# Altium footprint library 0422.PcbLib: 47 footprints (part 1 of 3)
Each footprint in its own frame and in the unit in brackets; x right, y up, seen from the top. Pads: shape width x height; smd on the part's side, far side on the other; paste and mask are expansions set on the pad; w line width, h text height; cw(c..) or ccw(c..) is an arc to the next point about the centre after c.
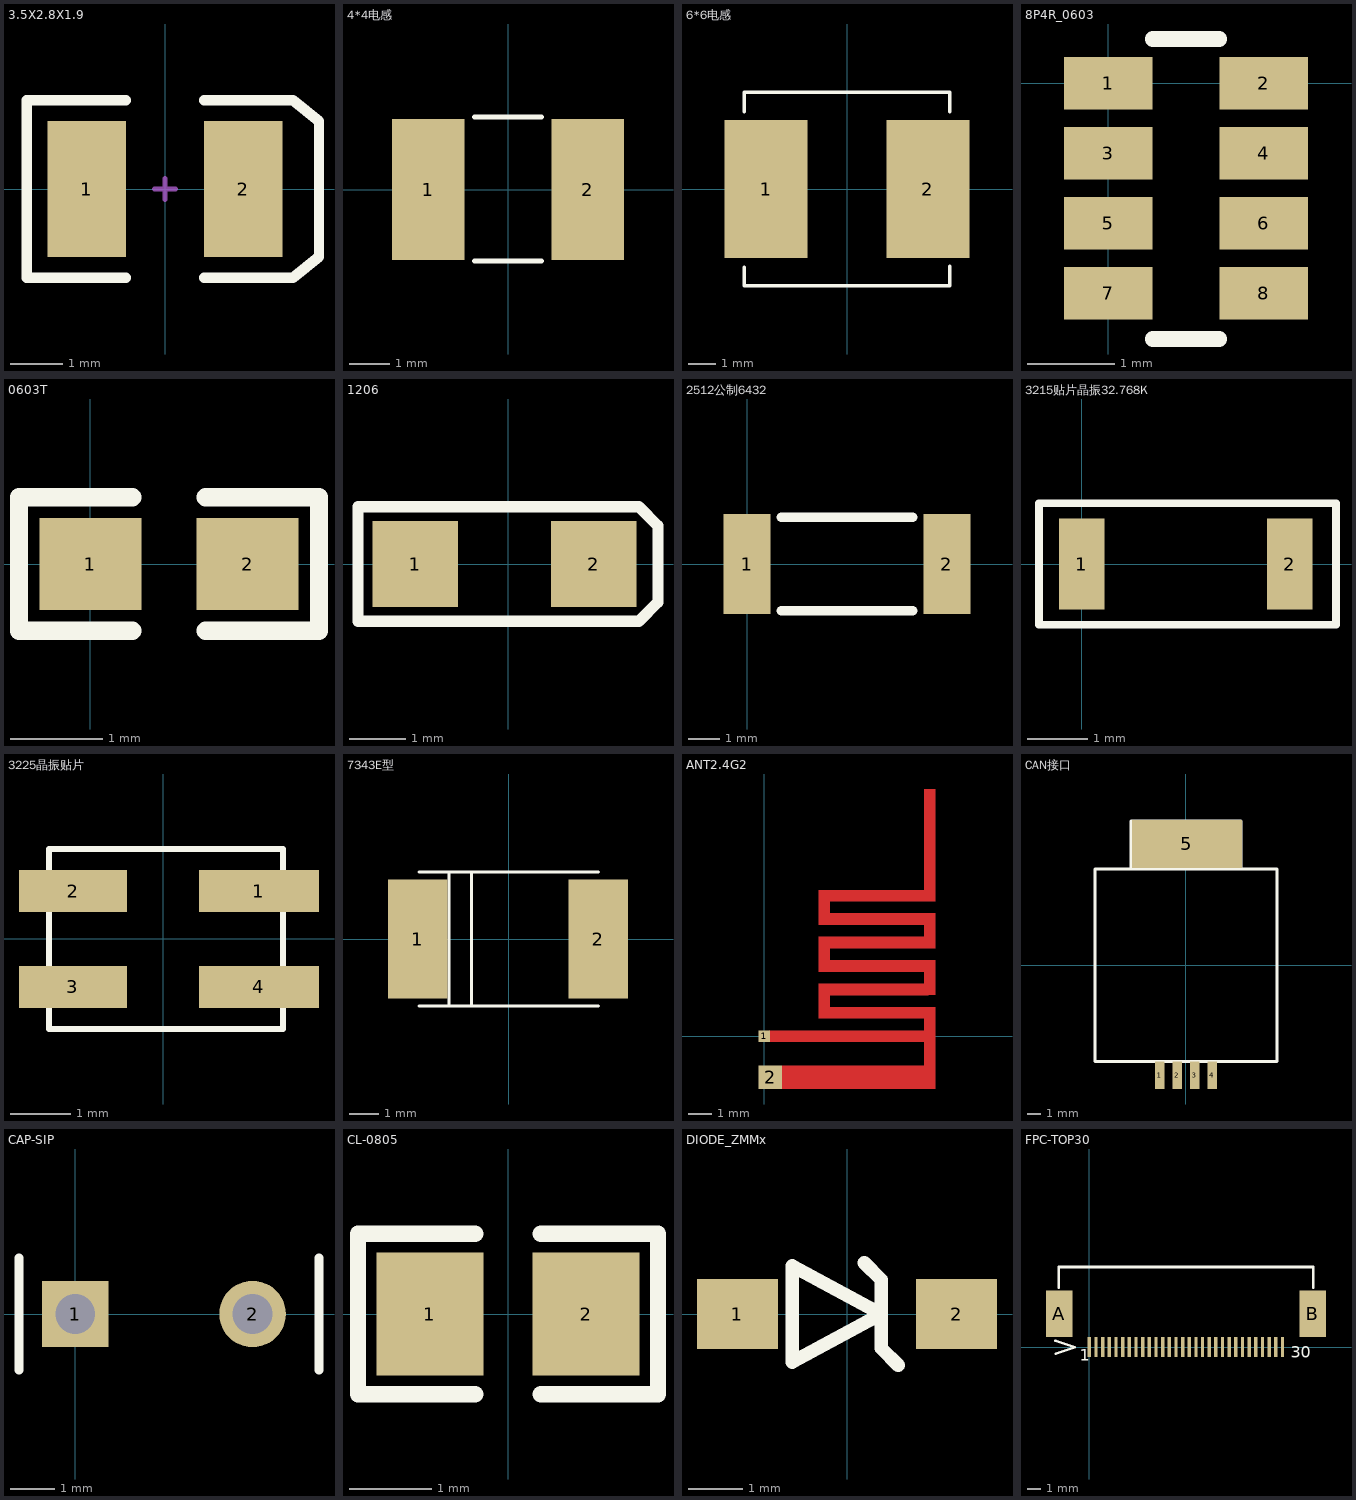
[diagram p0: the footprints below, top view; thin cyan lines are the x and y axes]

## 3.5X2.8X1.9 [mm] "SM LED; 2 C-Bend Leads; Body 3.5 x 2.8 x 1.9 mm, inc leads (LxWxH typ)"
height 1.9
pads (2):
  rect 1.5x2.6 smd: 1(-1.5,0) 2(1.5,0)
Top Overlay:
  lines w0.2: -0.75,-1.7 -2.65,-1.7 -2.65,1.7 -0.75,1.7 ; 0.75,-1.7 2.45,-1.7 2.95,-1.3 2.95,1.3 2.45,1.7 0.75,1.7
Mechanical 1:
  lines w0.1: -0.2,0 0.2,0 ; 0,-0.2 0,0.2

## 4*4电感 [mm]
pads (2):
  rect 1.8x3.5 smd: 1(-1.981,0) 2(1.981,0)
Top Overlay:
  lines w0.127: -0.838,-1.778 0.838,-1.778 ; -0.838,1.803 0.838,1.803

## 6*6电感 [mm]
pads (2):
  rect 3x5 smd: 1(-2.921,0) 2(2.921,0)
Top Overlay:
  lines w0.127: -3.708,-3.505 -3.708,-2.819 ; -3.708,2.794 -3.708,3.505 3.7,3.505 ; -3.7,-3.505 3.708,-3.505 3.708,-2.794 ; 3.708,2.794 3.708,3.505

## 8P4R_0603 [mm]
pads (8):
  rect 1.016x0.6 smd: 1(0,0) 2(1.778,0) 3(0,-0.8) 4(1.778,-0.8) 5(0,-1.6) 6(1.778,-1.6) 7(0,-2.4) 8(1.778,-2.4)
Top Overlay:
  lines w0.178: 0.508,-2.921 1.27,-2.921 ; 0.508,0.508 1.27,0.508

## 0603T [mm]
pads (2):
  rect 1.1x1 smd: 1(0,0) 2(1.7,0)
Top Overlay:
  lines w0.2: 0.45,-0.722 -0.772,-0.722 -0.772,0.722 0.45,0.722 ; 1.25,-0.722 2.472,-0.722 2.472,0.722 1.25,0.722

## 1206 [mil]
height 51.18
pads (2):
  rect 60x60 smd: 1(-65,0) 2(60,0)
Top Overlay:
  lines w8: -105,-40 -105,0 -105,40 91.67,40 105,26.67 105,-26.67 91.67,-40 -105,-40

## 2512公制6432 [mm]
pads (2):
  rect 1.5x3.2 smd: 1(0,0) 2(6.4,0)
Top Overlay:
  lines w0.3: 1.1,-1.5 5.3,-1.5 ; 1.1,1.5 5.3,1.5

## 3215贴片晶振32.768K [mm]
height 0.9
pads (2):
  rect 0.75x1.5 smd: 1(0,0) 2(3.429,0)
Top Overlay:
  lines w0.125: -0.7,-1 4.191,-1 4.191,1 -0.7,1 -0.7,-1

## 3225晶振贴片 [mm]
height 0.9
pads (4):
  rect 2x0.7 smd: 1(1.6,0.8) 4(1.6,-0.8)
  rect 1.8x0.7 smd: 2(-1.5,0.8) 3(-1.5,-0.8)
Top Overlay:
  lines w0.1: -1.9,-1.5 2,-1.5 2,1.5 -1.9,1.5 -1.9,-1.5

## 7343E型 [mm]
pads (2):
  rect 2x4 smd: 1(-3.05,0) 2(3,0)
Top Overlay:
  lines w0.1: -3,-2.25 3,-2.25 ; -3,2.25 3,2.25 ; -2,-2.25 -2,2.25 ; -1.25,-2.25 -1.25,2.25

## ANT2.4G2 [mm]
pads (2):
  rect 0.5x0.5 smd: 1(0,0)
  rect 1x1 smd paste+0 mask+0: 2(0.25,-1.75)
Top Layer:
  rectangle: 6.8,5.75 7.3,10.55
  rectangle: 2.3,5 2.8,6
  rectangle: 6.8,3.75 7.3,5.25
  rectangle: 2.3,3 2.8,4
  rectangle: 6.8,1.75 7.3,3.25
  rectangle: 2.3,1 2.8,2
  rectangle: 0.75,-2.25 7.3,-1.25
  rectangle: 0.2,-0.25 7,0.25
  rectangle: 6.8,-1.5 7.3,1.25
  rectangle: 2.3,0.75 7,1.25
  rectangle: 2.3,1.75 7,2.25
  rectangle: 2.3,2.75 7,3.25
  rectangle: 2.3,3.75 7,4.25
  rectangle: 2.3,4.75 7,5.25
  rectangle: 2.3,5.75 7,6.25

## CAN接口 [mm]
pads (5):
  rect 0.7x2 smd: 1(-1.905,-8) 2(-0.635,-8) 3(0.635,-8) 4(1.905,-8)
  rect 8x3.5 smd: 5(0.072,8.824)
Top Overlay:
  lines w0.2: -4,7.033 -4,8.215 -4,10.5 4,10.5 4,7.021 ; -6.625,-7 6.625,-7 6.625,7 -6.625,7 -6.625,-7

## CAP-SIP [mm]
pads (2):
  rect 1.5x1.5 hole 0.9: 1(0,0)
  round 1.5 hole 0.9: 2(4,0)
Top Overlay:
  lines w0.2: -1.27,-1.27 -1.27,1.27 ; 5.5,-1.27 5.5,1.27

## CL-0805 [mm]
pads (2):
  rect 1.3x1.5 smd: 1(-0.95,0) 2(0.95,0)
Top Overlay:
  lines w0.2: -0.4,-0.972 -1.822,-0.972 -1.822,0.972 -0.4,0.972 ; 0.4,-0.972 1.822,-0.972 1.822,0.972 0.4,0.972

## DIODE_ZMMx [mm]
pads (2):
  rect 1.5x1.3 smd: 1(-2.032,0) 2(2.032,0)
Top Overlay:
  lines w0.254: 0.318,0.953 0.635,0.635 0.635,-0.635 0.953,-0.953 ; -1.016,-0.889 -1.016,0.889 0.635,0 -1.016,-0.889

## FPC-TOP30 [mm]
pads (32):
  rect 0.25x1.5 smd: 1(0.003,0) 2(0.503,0) 3(1.003,0) 4(1.503,0) 5(2.003,0) 6(2.503,0) 7(3.003,0) 8(3.503,0) 9(4.003,0) 10(4.503,0) 11(5.003,0) 12(5.503,0) 13(6.003,0) 14(6.503,0) 15(7.003,0) 16(7.503,0) 17(8.003,0) 18(8.503,0) 19(9.003,0) 20(9.503,0) 21(10.003,0) 22(10.503,0) 23(11.003,0) 24(11.503,0) 25(12.003,0) 26(12.503,0) 27(13.003,0) 28(13.503,0) 29(14.003,0) 30(14.503,0)
  rect 2x3.5 smd: A(-2.25,2.5) B(16.768,2.5)
Top Overlay:
  lines w0.2: -2.54,0.466 -1.082,-0.02 -2.53,-0.503
  lines w0.203: -2.286,4.47 -2.286,6 16.8,6 16.815,5.985 16.815,4.47
  text "30" at 15.113,-0.787 h0.89
  text "1" at -0.711,-1.041 h0.89